# Altium footprint library lamp_controller.PcbLib: 67 footprints (part 4 of 5)
Each footprint in its own frame and in the unit in brackets; x right, y up, seen from the top. Pads: shape width x height; smd on the part's side, far side on the other; paste and mask are expansions set on the pad; w line width, h text height; cw(c..) or ccw(c..) is an arc to the next point about the centre after c.
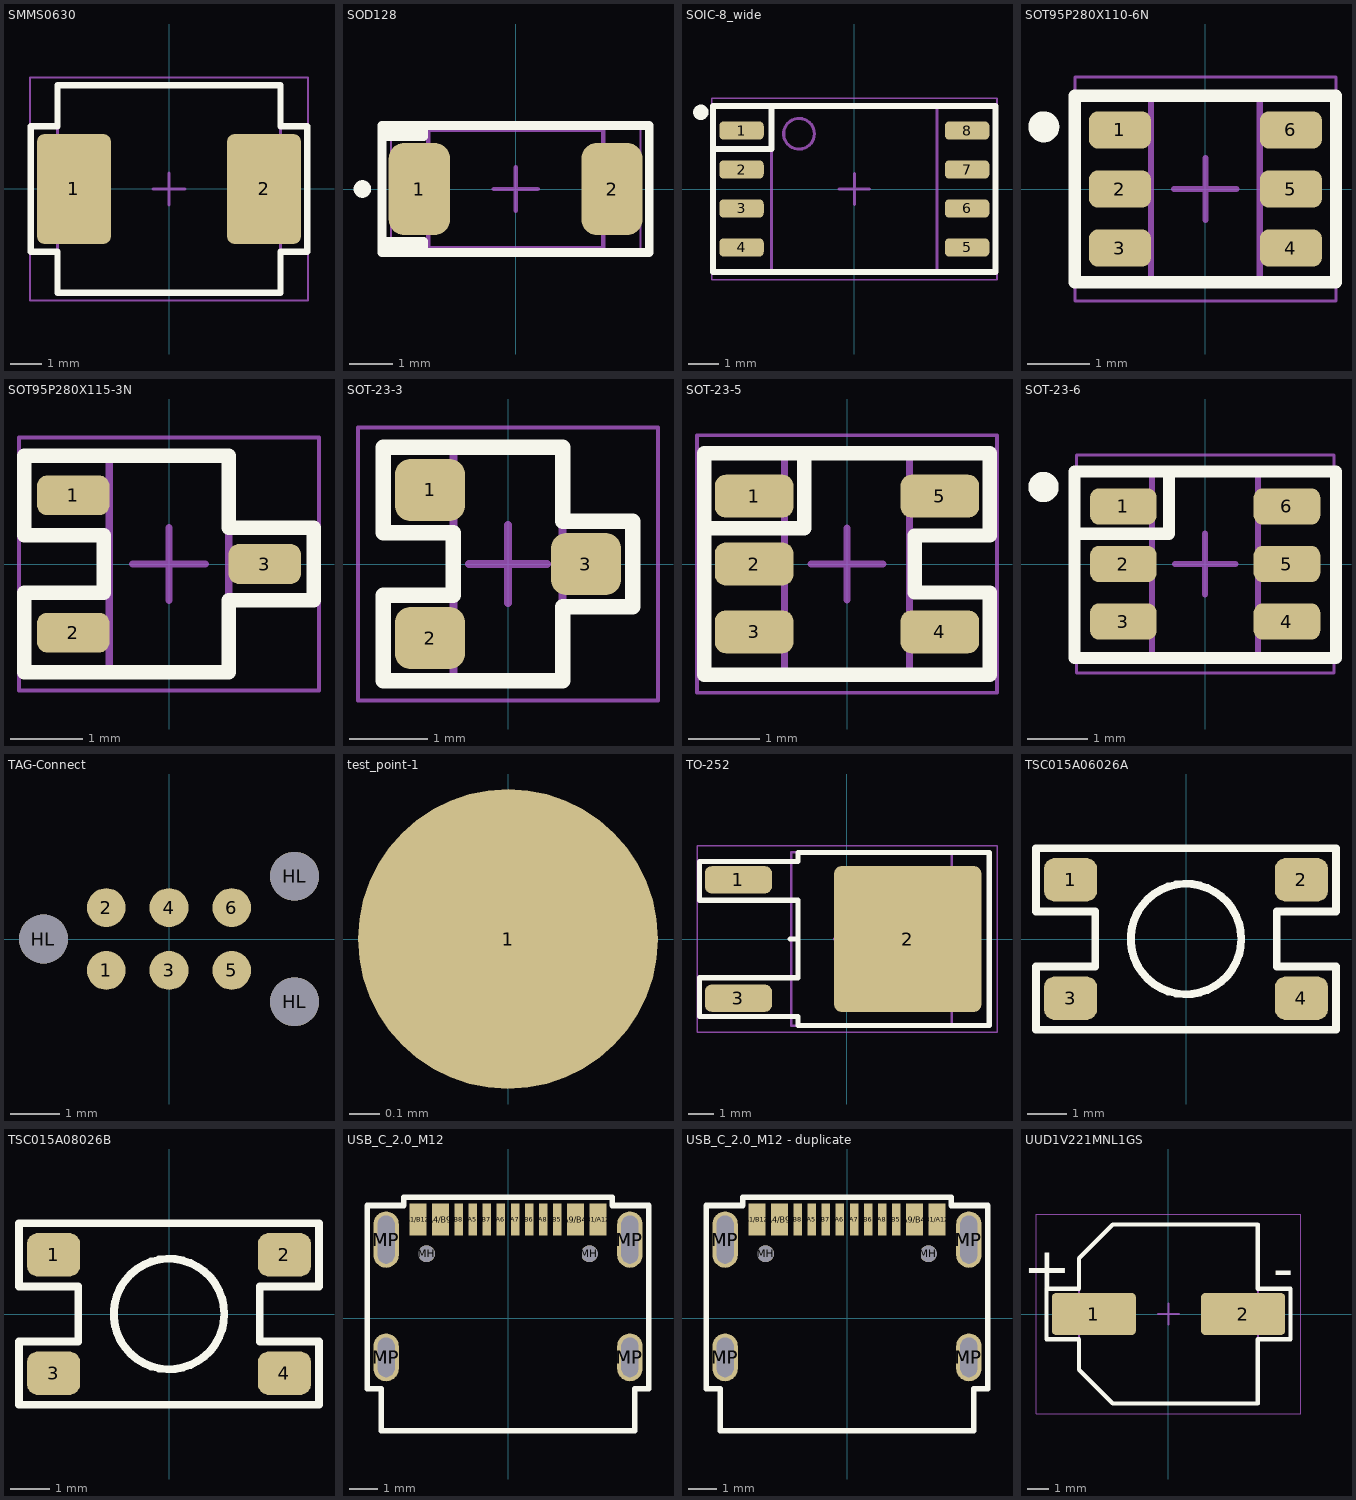
[diagram p3: the footprints below, top view; thin cyan lines are the x and y axes]

## SMMS0630 [mm] "Precision Wire Wound Inductor, 2-Leads, Body 7.10x6.60mm, IPC Medium Density"
height 3
pads (2):
  rrect20% 2.35x3.5 smd: 1(-3.025,0) 2(3.025,0)
Top Overlay:
  lines w0.2: -4.4,-2 -4.4,2 -3.55,2 -3.55,3.3 3.55,3.3 3.55,2 4.4,2 4.4,-2 3.55,-2 3.55,-3.3 -3.55,-3.3 -3.55,-2 -4.4,-2
Top Courtyard:
  lines w0.05: -4.425,-3.55 4.425,-3.55 4.425,3.55 -4.425,3.55 -4.425,-3.55
  lines w0.1: -0.5,0 0.5,0 ; 0,-0.5 0,0.5
Mechanical 13:
  lines w0.1: -3.55,-3.3 3.55,-3.3 3.55,3.3 -3.55,3.3 -3.55,-3.3
3D body "SMMS0630.step": height 3.1, standoff 0, extent -3.65,-3.3 3.65,3.3

## SOD128 [mm]
height 1.1
pads (2):
  rrect50% 1.4x2.1 smd: 1(-2.2,0) 2(2.2,0)
Top Overlay:
  circle w0.2: c-3.5,0 r0.1
  lines w0.2: -3.05,-1.2 -2.1,-1.2 -2.1,-1.45 ; -3.05,1.2 -2.1,1.2 -2.1,1.45 ; -3.05,1.325 -2.1,1.325 ; -3,-1.325 -2.1,-1.325 ; -3.05,-1.45 -3.05,1.45 3.05,1.45 3.05,-1.45 -3.05,-1.45
Mechanical 13:
  lines w0.1: -2,-1.35 2,-1.35 2,1.35 -2,1.35 -2,-1.35
Mechanical 15:
  lines w0.05: -2.85,-1.5 2.85,-1.5 2.85,1.5 -2.85,1.5 -2.85,-1.5
  lines w0.1: -0.5,0 0.5,0 ; 0,-0.5 0,0.5
3D body "SOD128.step": height 1.1, standoff 0, extent -2.35,-1.35 2.35,1.35

## SOIC-8_wide [mm]
height 2.16
pads (8):
  rrect50% 1.45x0.6 smd: 1(-3.675,1.905) 2(-3.675,0.635) 3(-3.675,-0.635) 4(-3.675,-1.905) 5(3.675,-1.905) 6(3.675,-0.635) 7(3.675,0.635) 8(3.675,1.905)
Top Overlay:
  circle w0.25: c-5,2.5 r0.125
  lines w0.2: -4.6,1.3 -2.7,1.3 -2.7,2.7 ; -4.6,-2.7 -4.6,2.7 4.6,2.7 4.6,-2.7 -4.6,-2.7
Mechanical 13:
  circle w0.1: c-1.8,1.8 r0.5
  lines w0.1: -2.7,-2.7 -2.7,2.7 2.7,2.7 2.7,-2.7 -2.7,-2.7
Mechanical 15:
  lines w0.05: -4.65,-2.95 -4.65,2.95 4.65,2.95 4.65,-2.95 -4.65,-2.95
  lines w0.1: -0.5,0 0.5,0 ; 0,-0.5 0,0.5
3D body "SOIC-8_wide.step": height 2.16, standoff 0, extent -3.95,-2.7 3.95,2.7

## SOT95P280X110-6N [mm] "SOT23, 6-Leads, Body 2,90x2,80mm, Pitch 0,95mm, IPC Medium Density"
height 1.1
pads (6):
  rrect50% 1x0.6 smd: 1(-1.375,0.95) 2(-1.375,0) 3(-1.375,-0.95) 4(1.375,-0.95) 5(1.375,0) 6(1.375,0.95)
Top Overlay:
  circle w0.25: c-2.6,1 r0.125
  lines w0.2: -2.1,-1.5 2.1,-1.5 2.1,1.5 -2.1,1.5 -2.1,-1.5
Mechanical 13:
  lines w0.1: -0.875,-1.525 -0.875,1.525 0.875,1.525 0.875,-1.525 -0.875,-1.525
Mechanical 15:
  lines w0.05: -2.1,-1.8 -2.1,1.8 2.1,1.8 2.1,-1.8 -2.1,-1.8
  lines w0.1: -0.5,0 0.5,0 ; 0,-0.5 0,0.5
3D body: height 1.1, standoff 0.15, extent -0.875,-1.525 0.875,1.525

## SOT95P280X115-3N [mm] "SOT23, 3-Leads, Body 2.92x2.80mm, Pitch 0.95mm, IPC Medium Density"
height 1.15
pads (3):
  rrect50% 1x0.55 smd: 1(-1.325,0.95) 2(-1.325,-0.95) 3(1.325,0)
Top Overlay:
  lines w0.2: -2,-1.5 0.825,-1.5 0.825,-0.5 2,-0.5 2,0.5 0.825,0.5 0.825,1.5 -2,1.5 -2,0.4 -0.9,0.4 -0.9,-0.4 -2,-0.4 -2,-1.5
Mechanical 13:
  lines w0.1: -0.825,-1.485 -0.825,1.485 0.825,1.485 0.825,-1.485 -0.825,-1.485
Mechanical 15:
  lines w0.05: -2.075,-1.75 -2.075,1.75 2.075,1.75 2.075,-1.75 -2.075,-1.75
  lines w0.1: -0.5,0 0.5,0 ; 0,-0.5 0,0.5
3D body "SOT95P280X115-3N.step": height 1.15, standoff 0, extent -1.45,-1.485 1.45,1.485

## SOT-23-3 [mm]
height 1.22
pads (3):
  rrect50% 0.9x0.8 smd: 1(-1,0.95) 2(-1,-0.95) 3(1,0)
Top Overlay:
  lines w0.2: -1.6,-1.5 -1.6,-0.4 -0.7,-0.4 -0.7,0.4 -1.6,0.4 -1.6,1.5 0.7,1.5 0.7,0.55 1.6,0.55 1.6,-0.55 0.7,-0.55 0.7,-1.5 -1.6,-1.5
Mechanical 13:
  lines w0.1: -0.7,-1.52 -0.7,1.52 0.7,1.52 0.7,-1.52 -0.7,-1.52
Mechanical 15:
  lines w0.05: -1.925,-1.75 -1.925,1.75 1.925,1.75 1.925,-1.75 -1.925,-1.75
  lines w0.1: -0.5,0 0.5,0 ; 0,-0.5 0,0.5
3D body "SOT23-3.step": height 1.22, standoff 0, extent -1.32,-1.52 1.32,1.52

## SOT-23-5 [mm] "SOT23, 5-Leads, Body 2.90x2.80mm, Pitch 0.95mm, IPC Medium Density"
height 1.45
pads (5):
  rrect50% 1.1x0.6 smd: 1(-1.3,0.95) 2(-1.3,0) 3(-1.3,-0.95) 4(1.3,-0.95) 5(1.3,0.95)
Top Overlay:
  lines w0.2: -2,0.5 -0.6,0.5 -0.6,1.55 ; -2,-1.55 2,-1.55 2,-0.4 0.95,-0.4 0.95,0.4 2,0.4 2,1.55 -2,1.55 -2,-1.55
Mechanical 13:
  lines w0.1: -0.875,-1.525 -0.875,1.525 0.875,1.525 0.875,-1.525 -0.875,-1.525
Mechanical 15:
  lines w0.05: -2.1,-1.8 -2.1,1.8 2.1,1.8 2.1,-1.8 -2.1,-1.8
  lines w0.1: -0.5,0 0.5,0 ; 0,-0.5 0,0.5
3D body "SOT-23-5.step": height 1.45, standoff 0, extent -1.5,-1.525 1.5,1.525

## SOT-23-6 [mm]
height 1.1
pads (6):
  rrect50% 1.1x0.6 smd: 1(-1.35,0.95) 2(-1.35,0) 3(-1.35,-0.95) 4(1.35,-0.95) 5(1.35,0) 6(1.35,0.95)
Top Overlay:
  circle w0.25: c-2.667,1.27 r0.125
  lines w0.2: -2.1,0.5 -0.6,0.5 -0.6,1.5 ; -2.159,-1.55 2.159,-1.55 2.159,1.524 -2.159,1.524 -2.159,-1.55
Mechanical 13:
  lines w0.1: -0.875,-1.525 -0.875,1.525 0.875,1.525 0.875,-1.525 -0.875,-1.525
Mechanical 15:
  lines w0.05: -2.125,-1.8 -2.125,1.8 2.125,1.8 2.125,-1.8 -2.125,-1.8
  lines w0.1: -0.5,0 0.5,0 ; 0,-0.5 0,0.5
3D body "SOT-23-6.step": height 1.1, standoff 0, extent -1.525,-1.525 1.525,1.525

## TAG-Connect [mm] "Debug header"
pads (9):
  round 0.787 smd paste-1: 1(-1.27,-0.635) 2(-1.27,0.635) 3(0,-0.635) 4(0,0.635) 5(1.27,-0.635) 6(1.27,0.635)
  round 0.991 hole 0.991 unplated mask+0: HL(-2.54,0) HL(2.54,-1.27) HL(2.54,1.27)

## test_point-1 [mm] "Test point"
pads (1):
  round 1 smd paste-1 mask+0: 1(0,0)

## TO-252 [mm] "D-PAK, 3-Pads, Body 6.20x6.71mm (max), IPC Medium Density"
height 2.39
pads (3):
  rrect50% 2.6x1.05 smd: 1(-4.2,2.29) 3(-4.2,-2.29)
  rrect10% 5.7x5.632 smd: 2(2.35,0)
Top Overlay:
  lines w0.2: -2.2,0 -1.9,0 ; -5.7,-3 -5.7,-1.5 -1.9,-1.5 -1.9,1.5 -5.7,1.5 -5.7,3 -1.9,3 -1.9,3.35 5.5,3.35 5.5,-3.35 -1.9,-3.35 -1.9,-3 -5.7,-3
Top Courtyard:
  lines w0.05: -5.8,-3.6 -5.8,3.6 5.8,3.6 5.8,-3.6 -5.8,-3.6
  lines w0.1: -0.5,0 0.5,0 ; 0,-0.5 0,0.5
Mechanical 13:
  lines w0.1: -2.15,-3.35 -2.15,3.35 4.05,3.35 4.05,-3.35 -2.15,-3.35
3D body "TO-252.step": height 2.39, standoff 0, extent -5.1,-3.35 4.805,3.35

## TSC015A06026A [mm]
height 6
pads (4):
  rrect50% 1.35x1.1 smd: 1(-2.925,1.5) 2(2.925,1.5) 3(-2.925,-1.5) 4(2.925,-1.5)
Top Overlay:
  circle w0.2: c0,0 r1.4
  lines w0.2: -3.8,-2.3 -3.8,-0.7 -2.3,-0.7 -2.3,0.7 -3.8,0.7 -3.8,2.3 3.8,2.3 3.8,0.7 2.3,0.7 2.3,-0.7 3.8,-0.7 3.8,-2.3 -3.8,-2.3
3D body "tsc015a06026a_6mm_button.sldprt": height 6.01, standoff 0.01, extent -3.4,-2.25 3.4,2.25

## TSC015A08026B [mm]
height 8
pads (4):
  rrect50% 1.35x1.1 smd: 1(-2.925,1.5) 2(2.925,1.5) 3(-2.925,-1.5) 4(2.925,-1.5)
Top Overlay:
  circle w0.2: c0,0 r1.4
  lines w0.2: -3.8,-2.3 3.8,-2.3 3.8,-0.7 2.3,-0.7 2.3,0.7 3.8,0.7 3.8,2.3 -3.8,2.3 -3.8,0.7 -2.3,0.7 -2.3,-0.7 -3.8,-0.7 -3.8,-2.3
3D body "tsc015a08026b.sldprt": height 8.01, standoff 0.01, extent -3.4,-2.25 3.4,2.25

## USB_C_2.0_M12 [mm] "HRO M12/GCT 4105 USB-C 2.0 CONNECTOR"
height 3.26
pads (22):
  rect 0.6x1.14 smd: A1/B12(-3.2,3.5) A4/B9(-2.4,3.5) A9/B4(2.4,3.5) B1/A12(3.2,3.5)
  rect 0.3x1.14 smd: A5(-1.25,3.5) A6(-0.25,3.5) A7(0.25,3.5) A8(1.25,3.5) B5(1.75,3.5) B6(0.75,3.5) B7(-0.75,3.5) B8(-1.75,3.5)
  round 0.6 hole 0.6 unplated: MH(-2.89,2.29) MH(2.89,2.29)
  oval 0.9x1.7 hole 0.6 slot 1.4 at 90 deg: MP(-4.325,-1.39) MP(4.325,-1.39)
  oval 0.9x1.7 on Top Paste: MP(-4.325,-1.39) MP(4.325,-1.39)
  oval 0.9x2 hole 0.6 slot 1.7 at 90 deg: MP(-4.325,2.79) MP(4.325,2.79)
  oval 0.9x2 on Top Paste: MP(-4.325,2.79) MP(4.325,2.79)
Top Overlay:
  lines w0.2: -5,-2.5 -5,4 -3.7,4 -3.7,4.3 3.7,4.3 3.7,4 5,4 5,-2.5 4.5,-2.5 4.5,-4 -4.5,-4 -4.5,-2.5 -5,-2.5
3D body "HRO TYPE-C-31-M-12.step": height 3.21, standoff -1, extent -4.475,-3.95 4.465,3.95

## USB_C_2.0_M12 - duplicate [mm] "HRO M12/GCT 4105 USB-C 2.0 CONNECTOR"
height 3.26
pads (22):
  rect 0.6x1.14 smd: A1/B12(-3.2,3.5) A4/B9(-2.4,3.5) A9/B4(2.4,3.5) B1/A12(3.2,3.5)
  rect 0.3x1.14 smd: A5(-1.25,3.5) A6(-0.25,3.5) A7(0.25,3.5) A8(1.25,3.5) B5(1.75,3.5) B6(0.75,3.5) B7(-0.75,3.5) B8(-1.75,3.5)
  round 0.6 hole 0.6 unplated: MH(-2.89,2.29) MH(2.89,2.29)
  oval 0.9x1.7 hole 0.6 slot 1.4 at 90 deg: MP(-4.325,-1.39) MP(4.325,-1.39)
  oval 0.9x1.7 on Top Paste: MP(-4.325,-1.39) MP(4.325,-1.39)
  oval 0.9x2 hole 0.6 slot 1.7 at 90 deg: MP(-4.325,2.79) MP(4.325,2.79)
  oval 0.9x2 on Top Paste: MP(-4.325,2.79) MP(4.325,2.79)
Top Overlay:
  lines w0.2: -5,-2.5 -5,4 -3.7,4 -3.7,4.3 3.7,4.3 3.7,4 5,4 5,-2.5 4.5,-2.5 4.5,-4 -4.5,-4 -4.5,-2.5 -5,-2.5
3D body "HRO TYPE-C-31-M-12.step": height 3.21, standoff -1, extent -4.475,-3.95 4.465,3.95

## UUD1V221MNL1GS [mm] "Aluminum Electrolytic Capacitor, Body 8.30x8.30x10.80mm, IPC Medium Density"
height 10.8
pads (2):
  rrect20% 4x2 smd: 1(-3.55,0) 2(3.55,0)
Top Overlay:
  lines w0.2: -5.8,-1.2 -4.25,-1.2 -4.25,-2.65 -2.65,-4.25 4.25,-4.25 4.25,-1.2 5.8,-1.2 5.8,1.2 4.25,1.2 4.25,4.25 -2.65,4.25 -4.25,2.65 -4.25,1.2 -5.8,1.2 -5.8,-1.2
  text "-" at 5.966,1.2 h2
  text "+" at -4.634,1.2 h2
Mechanical 13:
  lines w0.1: -4.25,-2.625 -4.25,2.625 -2.625,4.25 4.25,4.25 4.25,-4.25 -2.625,-4.25 -4.25,-2.625
Mechanical 15:
  lines w0.05: -6.3,-4.75 6.3,-4.75 6.3,4.75 -6.3,4.75 -6.3,-4.75
  lines w0.1: -0.5,0 0.5,0 ; 0,-0.5 0,0.5
3D body "eee-ft1e471gv_capacitor.step": height 10.51, standoff 0.01, extent -4.85,-4.15 4.85,4.15